# Altium footprint library SWLIB(150721).PcbLib: 348 footprints (part 1 of 22)
Each footprint in its own frame and in the unit in brackets; x right, y up, seen from the top. Pads: shape width x height; smd on the part's side, far side on the other; paste and mask are expansions set on the pad; w line width, h text height; cw(c..) or ccw(c..) is an arc to the next point about the centre after c.
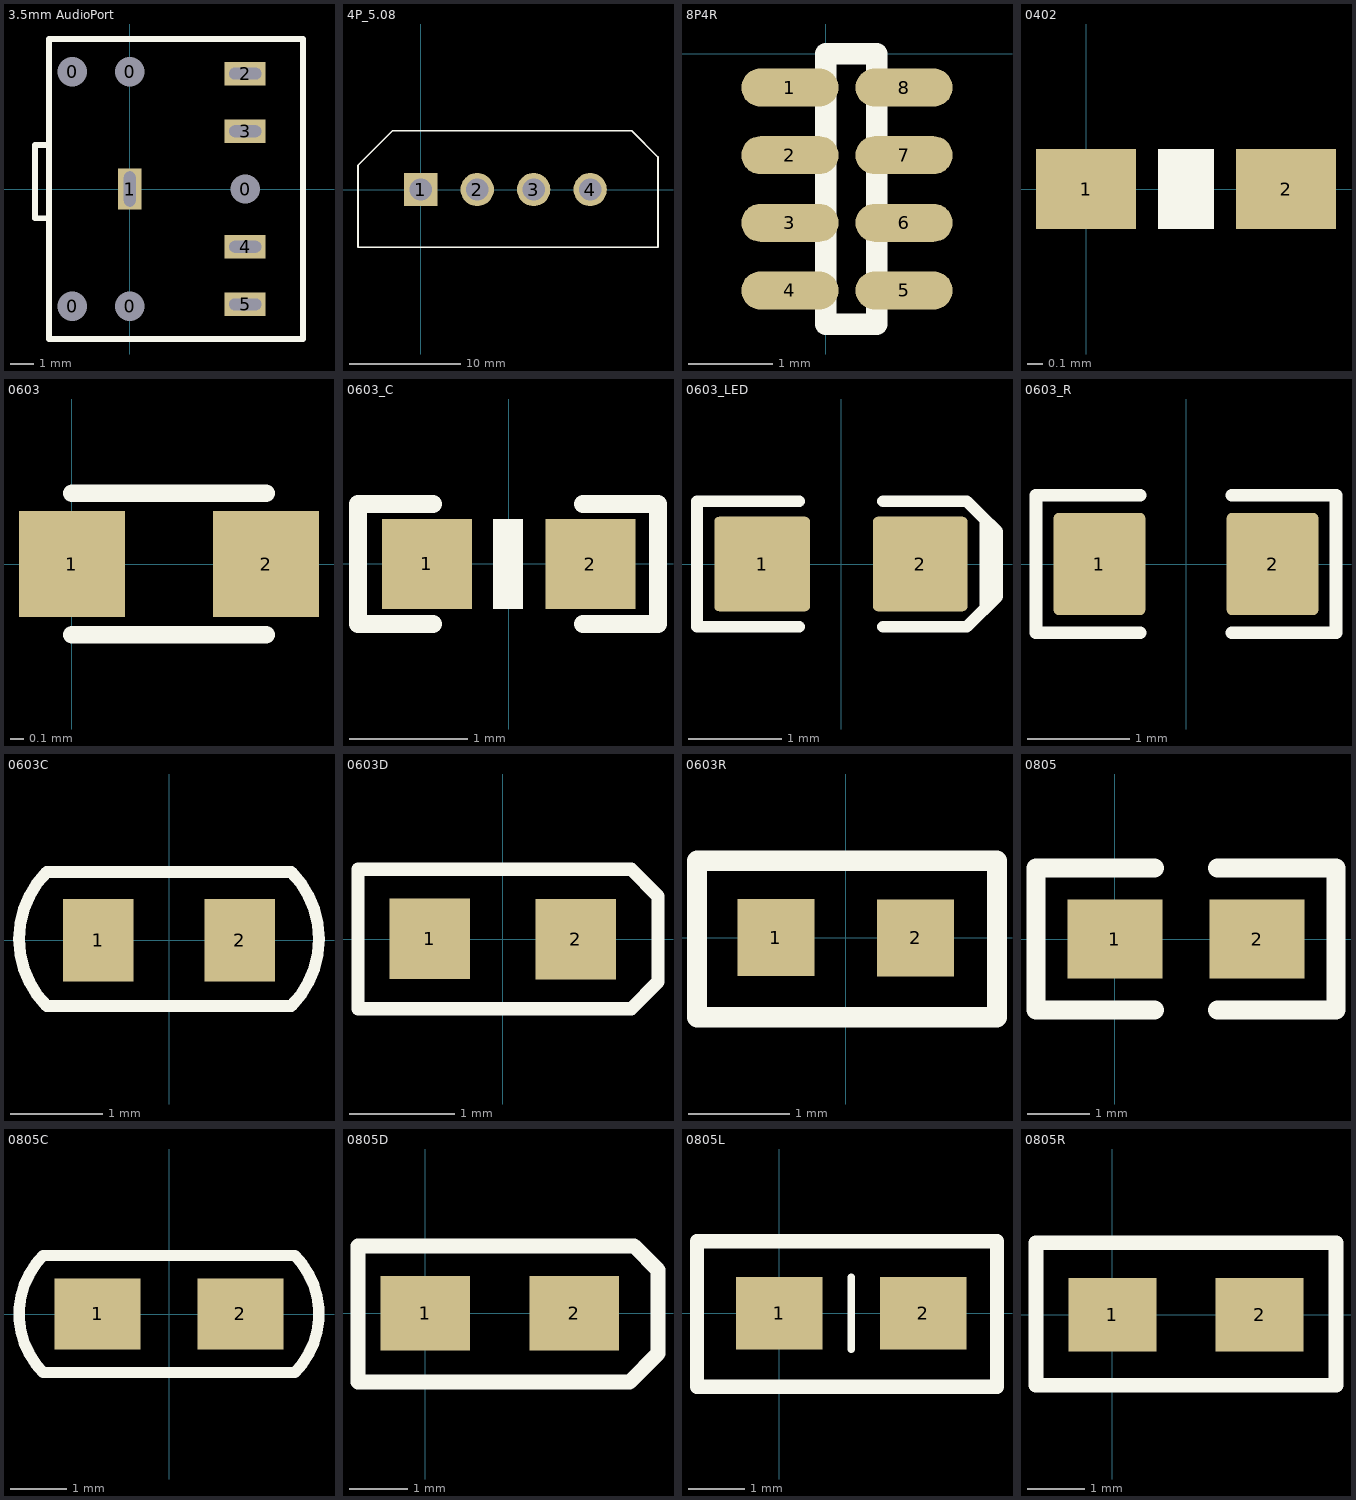
[diagram p0: the footprints below, top view; thin cyan lines are the x and y axes]

## 3.5mm AudioPort [mm]
height 12.93
pads (10):
  round 1 hole 1.27: 0(-2.489,-5.08) 0(-2.489,5.08) 0(0,-5.08) 0(0,5.08) 0(5,0)
  rect 1.016x1.778 hole 0.508 slot 1.524 at 90 deg paste+0: 1(0,0)
  rect 1.778x1.016 hole 0.508 slot 1.397 at 0 deg paste+0: 2(5,5) 3(5,2.5) 4(5,-2.5) 5(5,-5)
Top Overlay:
  lines w0.254: -3.5,-1.27 -4.104,-1.27 -4.104,0.381 -4.104,1.905 -3.5,1.905 ; -3.5,-6.5 7.5,-6.5 7.5,6.5 -3.5,6.5 -3.5,-6.5

## 4P_5.08 [mm]
pads (4):
  rect 3x3 hole 2: 1(0,0)
  round 3 hole 2: 2(5.08,0) 3(10.16,0) 4(15.24,0)
Top Overlay:
  lines w0.152: -5.639,-5.182 -5.639,2.184 -2.54,5.283 18.974,5.283 21.336,2.921 21.336,-3.353 21.336,-5.182 -5.639,-5.182

## 8P4R [mm] "0603"
pads (8):
  oval 1.15x0.45 smd: 1(-0.425,-0.4) 2(-0.425,-1.2) 3(-0.425,-2) 4(-0.425,-2.8) 5(0.925,-2.8) 6(0.925,-2) 7(0.925,-1.2) 8(0.925,-0.4)
Top Overlay:
  lines w0.254: 0,-3.2 0,0 0.6,0 0.6,-3.2 0,-3.2

## 0402 [mil]
pads (2):
  rect 25x20 smd: 1(0,0) 2(50,0)
Top Overlay:
  rectangle: 18,-10 32,10

## 0603 [mil]
pads (2):
  rect 30x30 smd: 1(0,0) 2(55,0)
Top Overlay:
  lines w5: 0,-20 55,-20 ; 0,20 55,20

## 0603_C [mil]
height 224.41
pads (2):
  rect 30x30 smd: 1(-27.25,0.03) 2(27.25,-0.03)
Top Overlay:
  region: 4.77,-15.01 4.77,14.99 -5.23,14.99 -5.23,-15.01
  lines w6: -25.25,-20.03 -50.25,-20.03 -50.25,19.97 -25.25,19.97 ; 24.75,-20.03 49.75,-20.03 49.75,19.97 24.75,19.97
3D body "CAP_0603.STEP": height 34.92, standoff -0.51, extent -33.46,-17.71 33.47,17.72

## 0603_LED [mil]
height 224.41
pads (2):
  rrect10% 40.5x40 smd: 1(-33.46,0)
  rrect10% 40x40 smd: 2(33.46,0)
Top Overlay:
  lines w5: -17.72,-26.57 -61.02,-26.57 -61.02,26.57 -17.72,26.57 ; 17.72,-26.57 53.15,-26.57 61.02,-18.7 61.02,18.7 53.15,26.57 17.72,26.57 ; 59.06,20.67 65.94,13.78 65.94,-13.78 60.04,-19.68
3D body "LED 0603 APT1608 RED.STEP": height 29.53, standoff 0, extent -31.49,-15.74 31.5,15.76

## 0603_R [mm]
height 5.7
pads (2):
  rrect10% 0.9x1 smd: 1(-0.85,0) 2(0.85,0)
Top Overlay:
  lines w0.127: -0.45,-0.675 -1.473,-0.675 -1.473,0.675 -0.45,0.675 ; 0.45,-0.675 1.473,-0.675 1.473,0.675 0.45,0.675
3D body "User Library-RES_1609-0603.STEP": height 0.56, standoff 0, extent -0.85,-0.381 0.85,0.419

## 0603C [mil]
pads (2):
  rect 30x35 smd: 1(-30,0) 2(30,0)
Top Overlay:
  lines w5: -52,-28 cw(c-23.5,0.5) -52,29 52,29 cw(c23.5,0.5) 52,-28 -52,-28
3D body "Capacitor 0603 SMD.step": height 35.04, standoff -0.39, extent -50.17,-18.4 52.2,20.97

## 0603D [mil]
pads (2):
  rect 30x30 smd: 1(-27.25,0.03) 2(27.25,-0.03)
Top Overlay:
  lines w5: -54,-26 48,-26 58,-16 58,16 48,26 10,26 -51,26 -54,26 -54,-26
3D body: height 19.68, standoff 3.94, extent 25,-15 33,15
3D body: height 19.68, standoff 3.94, extent -31,-15 25,15

## 0603R [mil]
pads (2):
  rect 30x30 smd: 1(-27.25,0.03) 2(27.25,-0.03)
Top Overlay:
  lines w7.87: -58,-31 59,-31 59,30 -58,30 -58,-31
3D body "R0603.STEP": height 17.72, standoff 0, extent -31.49,-15.74 31.5,15.75

## 0805 [mil]
pads (2):
  rect 60x50 smd: 1(0,0) 2(90,0)
Top Overlay:
  lines w12: 25,-45 -50,-45 -50,45 25,45 ; 65,-45 140,-45 140,45 65,45

## 0805C [mil]
pads (2):
  rect 60x50 smd: 1(-50,0) 2(50,0)
Top Overlay:
  lines w7.87: -88,-41 cw(c-47,0) -88,41 88,41 cw(c47,0) 88,-41 -88,-41
3D body "Capacitor 0805 SMD.step": height 36.61, standoff -0.39, extent -59.09,-27.27 59.03,27.85

## 0805D [mil]
pads (2):
  rect 60x50 smd: 1(0,0) 2(100,0)
Top Overlay:
  lines w10: -45,-46 137,-46 156,-27 156,29 140,45 132,45 -45,45 -45,-46

## 0805L [mil]
pads (2):
  rect 60x50 smd: 1(0,0) 2(100,0)
Top Overlay:
  lines w5: 50,-25 50,25
  lines w10: -57,-51 151,-51 151,50 -57,50 -57,-51

## 0805R [mil]
pads (2):
  rect 60x50 smd: 1(0,0) 2(100,0)
Top Overlay:
  lines w10: -52,-48 152,-48 152,49 -52,49 -52,-48